# Altium footprint library aiskylab-14Connectors-19PWRCon.PcbLib: 63 footprints (part 3 of 4)
Each footprint in its own frame and in the unit in brackets; x right, y up, seen from the top. Pads: shape width x height; smd on the part's side, far side on the other; paste and mask are expansions set on the pad; w line width, h text height; cw(c..) or ccw(c..) is an arc to the next point about the centre after c.
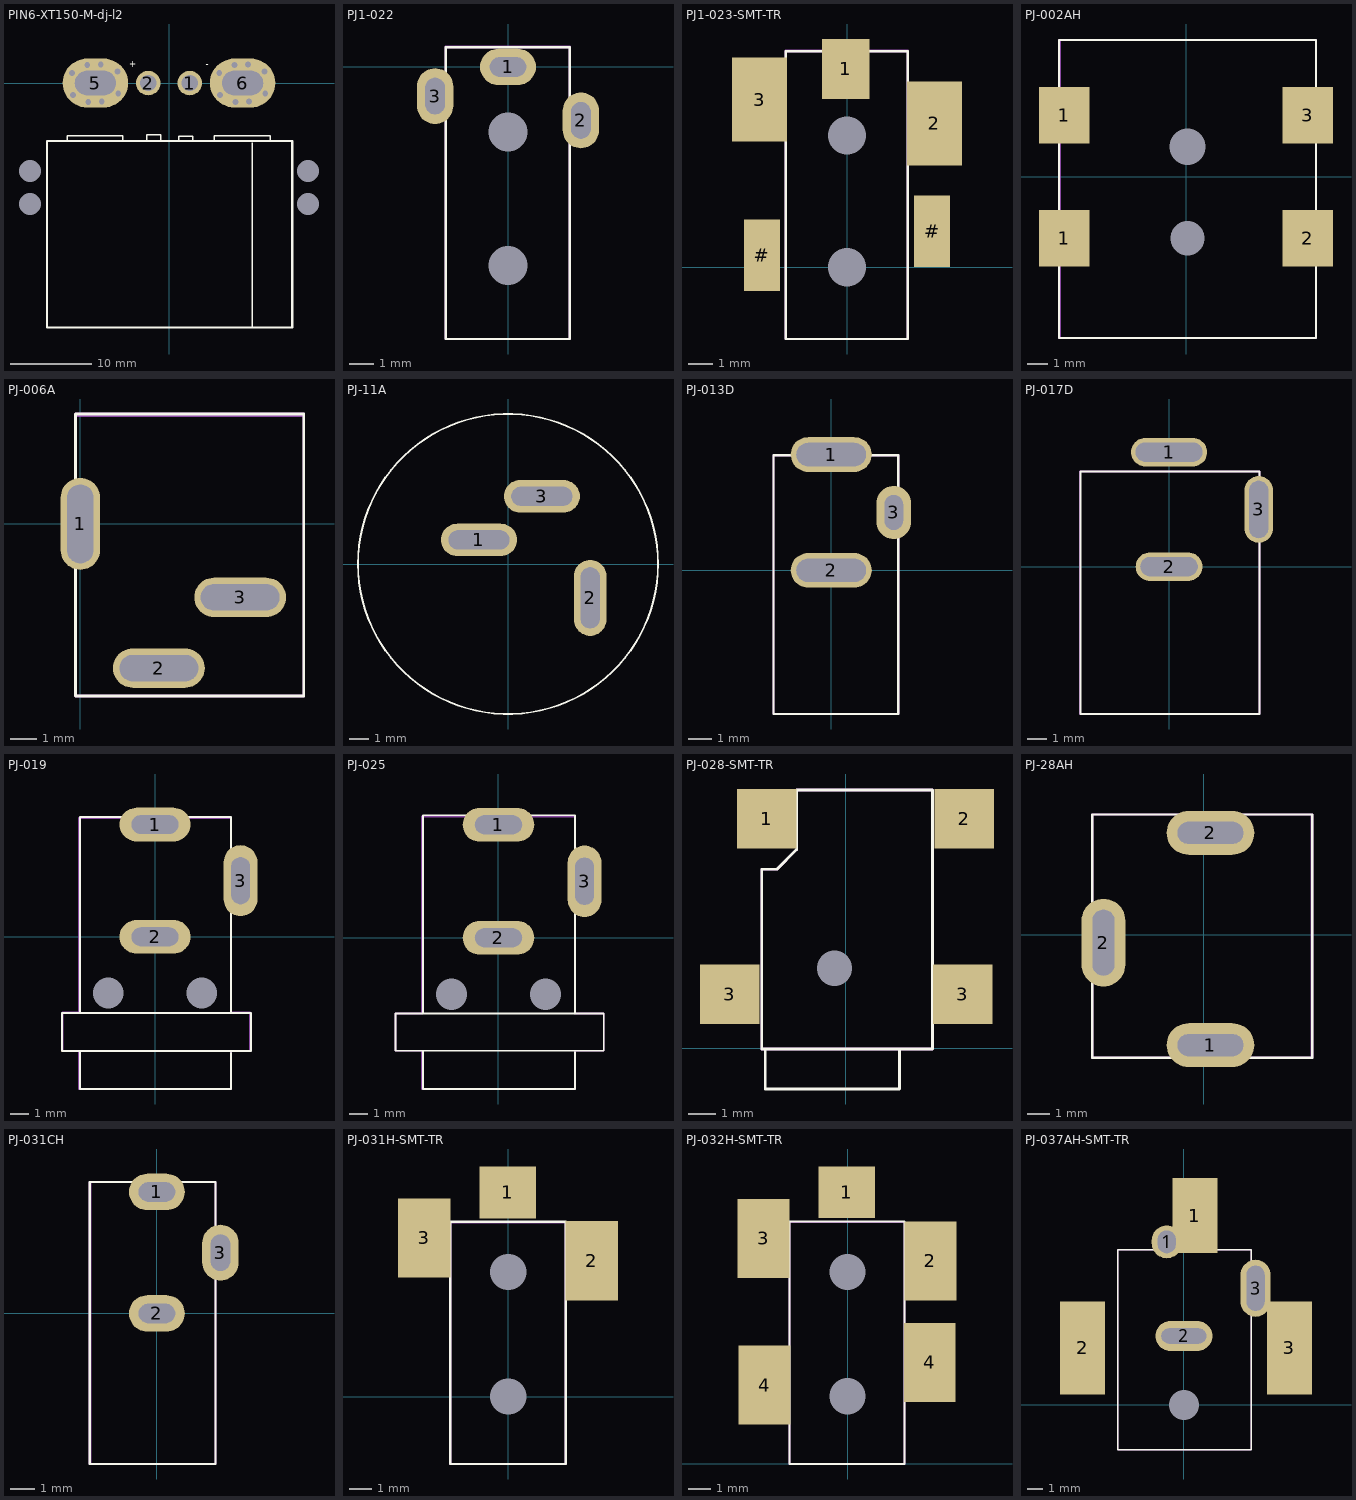
[diagram p2: the footprints below, top view; thin cyan lines are the x and y axes]

## PIN6-XT150-M-dj-l2 [mm]
height 24
pads (8):
  round 0 hole 2.7: 0(-17,-14.778) 0(-17,-10.778) 0(17,-14.778) 0(17,-10.778)
  round 3 hole 2: 1(2.54,0) 2(-2.54,0)
  oval 8x6 hole 3 slot 5 at 0 deg: 5(-9,0) 6(9,0)
via -6.214,-1.27 diameter 1.27 hole 0.711
via -8.221,-2.261 diameter 1.27 hole 0.711
via -9.872,-2.311 diameter 1.27 hole 0.711
via -11.752,-1.448 diameter 1.27 hole 0.711
via -11.853,1.219 diameter 1.27 hole 0.711
via -9.999,2.21 diameter 1.27 hole 0.711
via -8.348,2.261 diameter 1.27 hole 0.711
via -6.316,1.397 diameter 1.27 hole 0.711
via 11.684,1.397 diameter 1.27 hole 0.711
via 9.652,2.261 diameter 1.27 hole 0.711
via 8.001,2.21 diameter 1.27 hole 0.711
via 6.147,1.219 diameter 1.27 hole 0.711
via 6.248,-1.448 diameter 1.27 hole 0.711
via 8.128,-2.311 diameter 1.27 hole 0.711
via 9.779,-2.261 diameter 1.27 hole 0.711
via 11.786,-1.27 diameter 1.27 hole 0.711
Top Overlay:
  lines w0.178: -12.446,-7.087 -12.446,-6.452 -5.639,-6.452 -5.639,-7.137 ; -2.692,-6.96 -2.692,-6.325 -1.008,-6.325 -1.008,-7.01 ; 1.194,-7.112 1.194,-6.477 2.879,-6.477 2.879,-7.163 ; 5.554,-7.087 5.554,-6.452 12.361,-6.452 12.361,-7.137 ; 10.211,-29.921 10.211,-7.29 ; 14.173,-7.061 14.199,-7.087
  lines w0.254: -14.924,-29.896 -14.924,-7.087 15.076,-7.087 15.076,-29.896 -14.924,-29.896
  text "+" at -4.877,2.692 h0.76
  text "-" at 4.47,2.515 h0.76
Bottom Overlay:
  text "+" at -4.473,2.521 h0.51
  text "+" at -4.369,2.692 h0.76
  text "-" at 4.978,2.515 h0.76
Top Designator:
  text ".Designator" at -7.72,-13.968 h1.52
3D body "XT150压条.STEP": height 18, standoff 3, extent -19.102,-16.827 18.898,-8.827
3D body "AS150U-M.STEP": height 19.47, standoff 0.17, extent -16.399,-29.862 16.501,-3.962

## PJ1-022 [mm] "CONN PWR JACK 0.7X2.35MM SOLDER CUI inc"
height 22.7
pads (5):
  oval 2.3x1.5 hole 0.8 slot 1.5 at 0 deg: 1(0,0)
  oval 1.5x2.3 hole 0.8 slot 1.5 at 90 deg: 2(3,-2.2) 3(-3,-1.2)
  round 0 hole 1.6: #(0,-8.177) #(0,-2.677)
Top Overlay:
  lines w0.1: -2.565,-11.2 -2.565,0.814 2.54,0.814 2.54,-11.2 -2.565,-11.2
Top Designator:
  text ".Designator" at -7.618,-5.688 h1.52
Top Component Outline:
  lines w0.1: -2.565,-11.2 -2.565,0.84 2.54,0.84 2.54,-11.2 -2.565,-11.2
Top 3D Body:
  lines w0.1: -2.565,-11.2 -2.565,0.814 2.54,0.814 2.54,-11.2 -2.565,-11.2
3D body "pj1-022.stp": height 5.1, standoff -2.9, extent -3.251,-11.2 3.149,0.8

## PJ1-023-SMT-TR [mm] "CONN PWR JACK 0.7X2.35MM SOLDER CUI inc"
height 22.7
pads (7):
  rect 2x2.5 smd: 1(-0.051,8.276)
  rect 2.3x3.5 smd: 2(3.65,6) 3(-3.65,7)
  rect 1.5x3 smd: #(-3.55,0.5) #(3.55,1.5)
  round 0 hole 1.6: #(0,0) #(0,5.5)
Top Overlay:
  lines w0.1: -2.565,-3 -2.565,9.014 2.54,9.014 2.54,-3 -2.565,-3
Top Designator:
  text ".Designator" at -7.618,2.781 h1.52
Top Component Outline:
  lines w0.1: -2.565,-3 2.54,-3 2.54,9.04 -2.565,9.04 -2.565,-3
Top 3D Body:
  lines w0.1: -2.565,-3 -2.565,9.014 2.54,9.014 2.54,-3 -2.565,-3
3D body "pj1-023-smt-tr.stp": height 5.3, standoff -0.7, extent -4.1,-3.001 4.1,9.499

## PJ-002AH [mm] "CONN PWR JACK 2X5.5MM SOLDER CUI inc"
height 24
pads (6):
  rect 2.5x2.8 smd: 1(-6.02,-3.05) 1(-6.02,3.05) 2(6.02,-3.05) 3(6.02,3.05)
  round 0 hole 1.7: #(0.076,-3.046)
  round 0 hole 1.8: #(0.076,1.475)
Top Overlay:
  lines w0.1: -6.274,-7.974 6.427,-7.974 6.427,6.758 -6.274,6.758 -6.274,-7.974
Top Designator:
  text ".Designator" at -7.618,-1.103 h1.52
Top Component Outline:
  lines w0.1: -6.223,-7.974 -6.223,6.758 6.427,6.758 6.427,-7.974 -6.223,-7.974
Top 3D Body:
  lines w0.1: -6.274,-7.974 6.427,-7.974 6.427,6.758 -6.274,6.758 -6.274,-7.974
3D body "pj-002ah-smt-tr.stp": height 11, standoff -1.2, extent -6.351,-7.967 6.249,6.833

## PJ-006A [mm] "CONN PWR JACK 2X5.5MM SOLDER  CUI inc."
height 24
pads (3):
  oval 1.5x3.5 hole 1 slot 3 at 90 deg unplated: 1(0,0)
  oval 3.5x1.5 hole 1 slot 3 at 0 deg unplated: 2(2.997,-5.5) 3(6.096,-2.8)
Top Overlay:
  lines w0.1: -0.184,-6.565 8.516,-6.565 8.516,4.191 -0.184,4.191 -0.184,-6.565
Top Designator:
  text ".Designator" at -3.709,-1.695 h1.52
Top Component Outline:
  lines w0.1: -0.184,-6.565 -0.184,4.135 8.516,4.135 8.516,-6.565 -0.184,-6.565
Top 3D Body:
  lines w0.1: -0.184,-6.565 8.516,-6.565 8.516,4.191 -0.184,4.191 -0.184,-6.565
3D body "pj-006a.stp": height 13.2, standoff -4.8, extent -0.032,-6.552 8.668,4.148

## PJ-11A [mm] "板载用自添焊盘"
height 22.7
pads (3):
  oval 4x1.7 hole 1 slot 3.2 at 0 deg: 1(-1.524,1.27) 3(1.778,3.556)
  oval 1.7x4 hole 1 slot 3.2 at 90 deg: 2(4.318,-1.778)
Top Overlay:
  circle w0.1: c0,0 r7.878
Top Designator:
  text ".Designator" at -7.642,-0.508 h1.52
3D body "pj-011a.stp": height 14, standoff -3.9, extent -8.684,-7.9 8.636,7.9

## PJ-013D [mm] "CONN POWER JACK 1.3X3.4MM  CUI inc"
height 22.7
pads (3):
  oval 3.5x1.5 hole 1 slot 3 at 0 deg: 1(0,5) 2(0,0)
  oval 1.5x2.3 hole 0.8 slot 1.5 at 90 deg: 3(2.7,2.5)
Top Overlay:
  lines w0.1: -2.489,-6.2 2.896,-6.2 2.896,4.976 -2.489,4.976 -2.489,-6.2
Top Designator:
  text ".Designator" at -7.111,-0.532 h1.52
Top Component Outline:
  lines w0.1: -2.489,-6.2 2.896,-6.2 2.896,4.976 -2.489,4.976 -2.489,-6.2
Top 3D Body:
  lines w0.1: -2.489,-6.2 2.896,-6.2 2.896,4.976 -2.489,4.976 -2.489,-6.2
3D body "pj-013d.stp": height 7.5, standoff -3.4, extent -2.515,-6.206 2.885,6.202

## PJ-017D [mm] "CONN POWER JACK 1.3X3.4MM  CUI inc"
height 22.7
pads (3):
  oval 4x1.5 hole 1 slot 3.5 at 0 deg: 1(0,6)
  oval 3.5x1.5 hole 1 slot 3 at 0 deg: 2(0,0)
  oval 1.5x3.5 hole 1 slot 3 at 90 deg: 3(4.7,3)
Top Overlay:
  lines w0.1: -4.648,-7.722 -4.648,4.976 4.75,4.976 4.75,-7.722 -4.648,-7.722
Top Designator:
  text ".Designator" at -7.204,-0.968 h1.52
Top Component Outline:
  lines w0.1: -4.674,-7.722 -4.674,4.976 4.75,4.976 4.75,-7.722 -4.674,-7.722
Top 3D Body:
  lines w0.1: -4.674,-7.722 -4.674,4.976 4.75,4.976 4.75,-7.722 -4.674,-7.722
3D body "pj-017dh.stp": height 11, standoff -3.5, extent -4.65,-7.682 4.75,6.818

## PJ-019 [mm] "CONN POWER JACK 1X3.3X5.5MM CUI inc"
height 22.7
pads (5):
  oval 3.8x1.8 hole 1 slot 2.5 at 0 deg: 1(0,6) 2(0,0)
  oval 1.8x3.8 hole 1 slot 2.5 at 90 deg: 3(4.572,3)
  round 0 hole 1.65: #(-2.5,-3) #(2.5,-3)
Top Overlay:
  lines w0.1: -4.013,-6.1 -4.013,-8.122 4.064,-8.122 4.064,-6.192 ; -4.013,-4.064 -4.013,6.406 4.064,6.406 4.064,-4.064 ; -4.978,-6.1 5.131,-6.1 5.131,-4.449 5.131,-4.064 -4.978,-4.064 -4.978,-4.449 -4.978,-6.1
Top Designator:
  text ".Designator" at -7.345,-1.098 h1.52
Top Component Outline:
  lines w0.1: -4.953,-6.1 -4.064,-6.1 -4.064,-8.132 4.064,-8.132 4.064,-6.1 5.08,-6.1 5.08,-4.064 4.064,-4.064 4.064,6.346 -4.064,6.346 -4.064,-4.039 -4.953,-4.039 -4.953,-6.1
Top 3D Body:
  lines w0.1: -4.953,-6.1 -4.953,-4.064 -4.064,-4.064 -4.064,6.346 4.064,6.346 4.064,5.492 4.064,-4.039 5.08,-4.039 5.08,-6.1 4.064,-6.1 4.064,-8.132 -4.064,-8.132 -4.064,-6.1 -4.953,-6.1
3D body "pj-019.stp": height 11.5, standoff -3.68, extent -4.978,-8.133 5.022,6.367

## PJ-025 [mm] "CONN PWR JACK 1.4X4.3X6.5MM SLDR CUI inc"
height 22.7
pads (5):
  oval 3.8x1.8 hole 1 slot 2.5 at 0 deg: 1(0,6) 2(0,0)
  oval 1.8x3.8 hole 1 slot 2.5 at 90 deg: 3(4.572,3)
  round 0 hole 1.65: #(-2.5,-3) #(2.5,-3)
Top Overlay:
  lines w0.1: -4.013,-6 -4.013,-8.022 4.064,-8.022 4.064,-6.092 ; -4.013,-4.016 -4.013,6.506 4.064,6.506 4.064,-4.016 ; -5.461,-6 5.588,-6 5.588,-4.349 5.588,-4.016 -5.461,-4.016 -5.461,-4.349 -5.461,-6
Top Designator:
  text ".Designator" at -7.554,-1.048 h1.52
Top Component Outline:
  lines w0.1: -5.461,-6 -4.064,-6 -4.064,-8.032 4.064,-8.032 4.064,-6 5.588,-6 5.588,-4.016 4.064,-4.016 4.064,6.446 -4.064,6.446 -4.064,-4.016 -5.461,-4.016 -5.461,-6
Top 3D Body:
  lines w0.1: -5.461,-6 -5.461,-4.016 -4.064,-4.016 -4.064,6.446 4.064,6.446 4.064,5.592 4.064,-4.016 5.588,-4.016 5.588,-6 4.064,-6 4.064,-8.032 -4.064,-8.032 -4.064,-6 -5.461,-6
3D body "pj-025.stp": height 12.6, standoff -3.58, extent -5.478,-8.033 5.522,6.467

## PJ-028-SMT-TR [mm] "CONN PWR JACK 0.9X3.2MM SOLDER CUI Inc."
height 22.7
pads (5):
  rect 2.2x2.2 smd: 1(-2.931,8.5) 2(4.392,8.5) 3(-4.297,2) 3(4.327,2)
  round 0 hole 1.3: #(-0.417,2.964)
Top Overlay:
  lines w0.1: -2.979,-0.024 -2.979,-1.51 1.995,-1.51 1.995,-0.033 ; -3.107,-0.025 3.211,-0.025 3.211,9.559 -1.815,9.559 -1.815,7.363 -2.554,6.624 -3.107,6.624 -3.107,-0.025
Top Designator:
  text ".Designator" at -7.57,3.563 h1.52
Top Component Outline:
  lines w0.1: -3.108,-0.025 3.211,-0.025 3.211,9.559 -1.815,9.559 -1.815,7.363 -2.554,6.624 -3.108,6.624 -3.108,-0.025
Top 3D Body:
  lines w0.1: -3.108,-0.025 -3.108,6.624 -2.554,6.624 -1.815,7.363 -1.815,9.559 3.211,9.559 3.211,-0.025 -3.108,-0.025
3D body "pj-028-smt-tr.stp": height 4.5, standoff -0.8, extent -4.5,-1.5 4.5,9.5

## PJ-28AH [mm]
height 22.7
pads (3):
  oval 4x2 hole 1 slot 3 at 0 deg: 1(0.305,-5.029) 2(0.305,4.648)
  oval 2x4 hole 1 slot 3 at 90 deg: 2(-4.572,-0.356)
Top Overlay:
  lines w0.1: -5.08,-5.603 -5.08,5.486 4.95,5.486 4.95,-5.603 -5.08,-5.603
Top Designator:
  text ".Designator" at -7.953,-0.698 h1.52
Top Component Outline:
  lines w0.1: -5.08,-5.588 4.928,-5.588 4.928,5.486 -5.08,5.486 -5.08,-5.588
Top 3D Body:
  lines w0.1: -5.08,-5.613 4.953,-5.613 4.953,5.486 -5.08,5.486 -5.08,-5.613
3D body "pj-028ah.stp": height 19, standoff -3.5, extent -5.08,-5.603 4.95,5.552

## PJ-031CH [mm] "CONN PWR JACK 1X3.4MM SOLDER  CUI inc"
height 22.7
pads (3):
  oval 2.3x1.5 hole 0.8 slot 1.5 at 0 deg: 1(0,5) 2(0,0)
  oval 1.5x2.3 hole 0.8 slot 1.5 at 90 deg: 3(2.616,2.5)
Top Overlay:
  lines w0.1: -2.769,-6.198 -2.769,5.41 2.413,5.41 2.413,-6.198 -2.769,-6.198
Top Designator:
  text ".Designator" at -7.293,-0.706 h1.52
Top Component Outline:
  lines w0.1: -2.743,-6.198 -2.743,5.41 2.413,5.41 2.413,-6.198 -2.743,-6.198
Top 3D Body:
  lines w0.1: -2.769,-6.198 -2.769,5.41 2.413,5.41 2.413,-6.198 -2.769,-6.198
3D body "pj-031ch.stp": height 7.5, standoff -3.1, extent -2.692,-6.206 2.708,5.394

## PJ-031H-SMT-TR [mm] "CONN PWR JACK 0.7X2.35MM SOLDER CUI inc"
height 22.7
pads (5):
  rect 2.5x2.3 smd: 1(-0.025,9.014)
  rect 2.3x3.5 smd: 2(3.683,6) 3(-3.708,7)
  round 0 hole 1.6: #(0,0) #(0,5.5)
Top Overlay:
  lines w0.1: -2.565,-2.973 -2.565,7.722 2.54,7.722 2.54,-2.973 -2.565,-2.973
Top Designator:
  text ".Designator" at -7.63,3.111 h1.52
Top Component Outline:
  lines w0.1: -2.565,-2.973 -2.565,7.696 2.54,7.696 2.54,-2.973 -2.565,-2.973
Top 3D Body:
  lines w0.1: -2.565,-2.973 -2.565,7.696 2.54,7.696 2.54,-2.973 -2.565,-2.973
3D body "pj-031h-smt-tr.stp": height 5.2, standoff -0.6, extent -4.089,-3.029 4.111,9.271

## PJ-032H-SMT-TR [mm] "CONN PWR JACK 0.7X2.35MM SOLDER CUI inc"
height 22.7
pads (7):
  rect 2.5x2.3 smd: 1(-0.036,12.043)
  rect 2.3x3.5 smd: 2(3.672,9) 3(-3.719,10) 4(-3.678,3.5) 4(3.642,4.5)
  round 0 hole 1.6: #(0,3) #(0,8.5)
Top Overlay:
  lines w0.1: -2.576,0 -2.576,10.75 2.529,10.75 2.529,0 -2.576,0
Top Designator:
  text ".Designator" at -7.641,6.114 h1.52
Top Component Outline:
  lines w0.1: -2.576,0 2.529,0 2.529,10.725 -2.576,10.725 -2.576,0
Top 3D Body:
  lines w0.1: -2.576,0 -2.576,10.725 2.529,10.725 2.529,0 -2.576,0
3D body "pj-031h-smt-tr.stp": height 5.2, standoff -0.6, extent -4.1,0 4.1,12.3

## PJ-037AH-SMT-TR [mm] "CONN PWR JACK 2X5.5MM SOLDER CUI inc"
height 22.7
pads (7):
  oval 2x2.2 hole 1.2 slot 1.5 at 90 deg: １(-1.143,10.868)
  rect 3x5 smd: 1(0.736,12.621)
  rect 3x6.2 smd: 2(-6.757,3.8) 3(7.036,3.8)
  oval 3.8x2 hole 1 slot 3 at 0 deg: ２(0,4.595)
  oval 2x3.8 hole 1.2 slot 3 at 90 deg: ３(4.775,7.776)
  round 0 hole 2: #(0,0)
Top Overlay:
  lines w0.1: -4.42,-3 4.496,-3 4.496,10.335 -4.42,10.335 -4.42,-3
Top Designator:
  text ".Designator" at -7.478,5.578 h1.52
Top Component Outline:
  lines w0.1: -4.42,-3 -4.42,10.335 4.496,10.335 4.496,-3 -4.42,-3
Top 3D Body:
  lines w0.1: -4.42,-3 4.496,-3 4.496,10.335 -4.42,10.335 -4.42,-3
3D body "pj-037ah-smt-tr.stp": height 11.2, standoff -3.2, extent -7.676,-3.006 7.524,14.094